# Altium footprint library PowerProducts.PCBLIB: 166 footprints (part 2 of 11)
Each footprint in its own frame and in the unit in brackets; x right, y up, seen from the top. Pads: shape width x height; smd on the part's side, far side on the other; paste and mask are expansions set on the pad; w line width, h text height; cw(c..) or ccw(c..) is an arc to the next point about the centre after c.
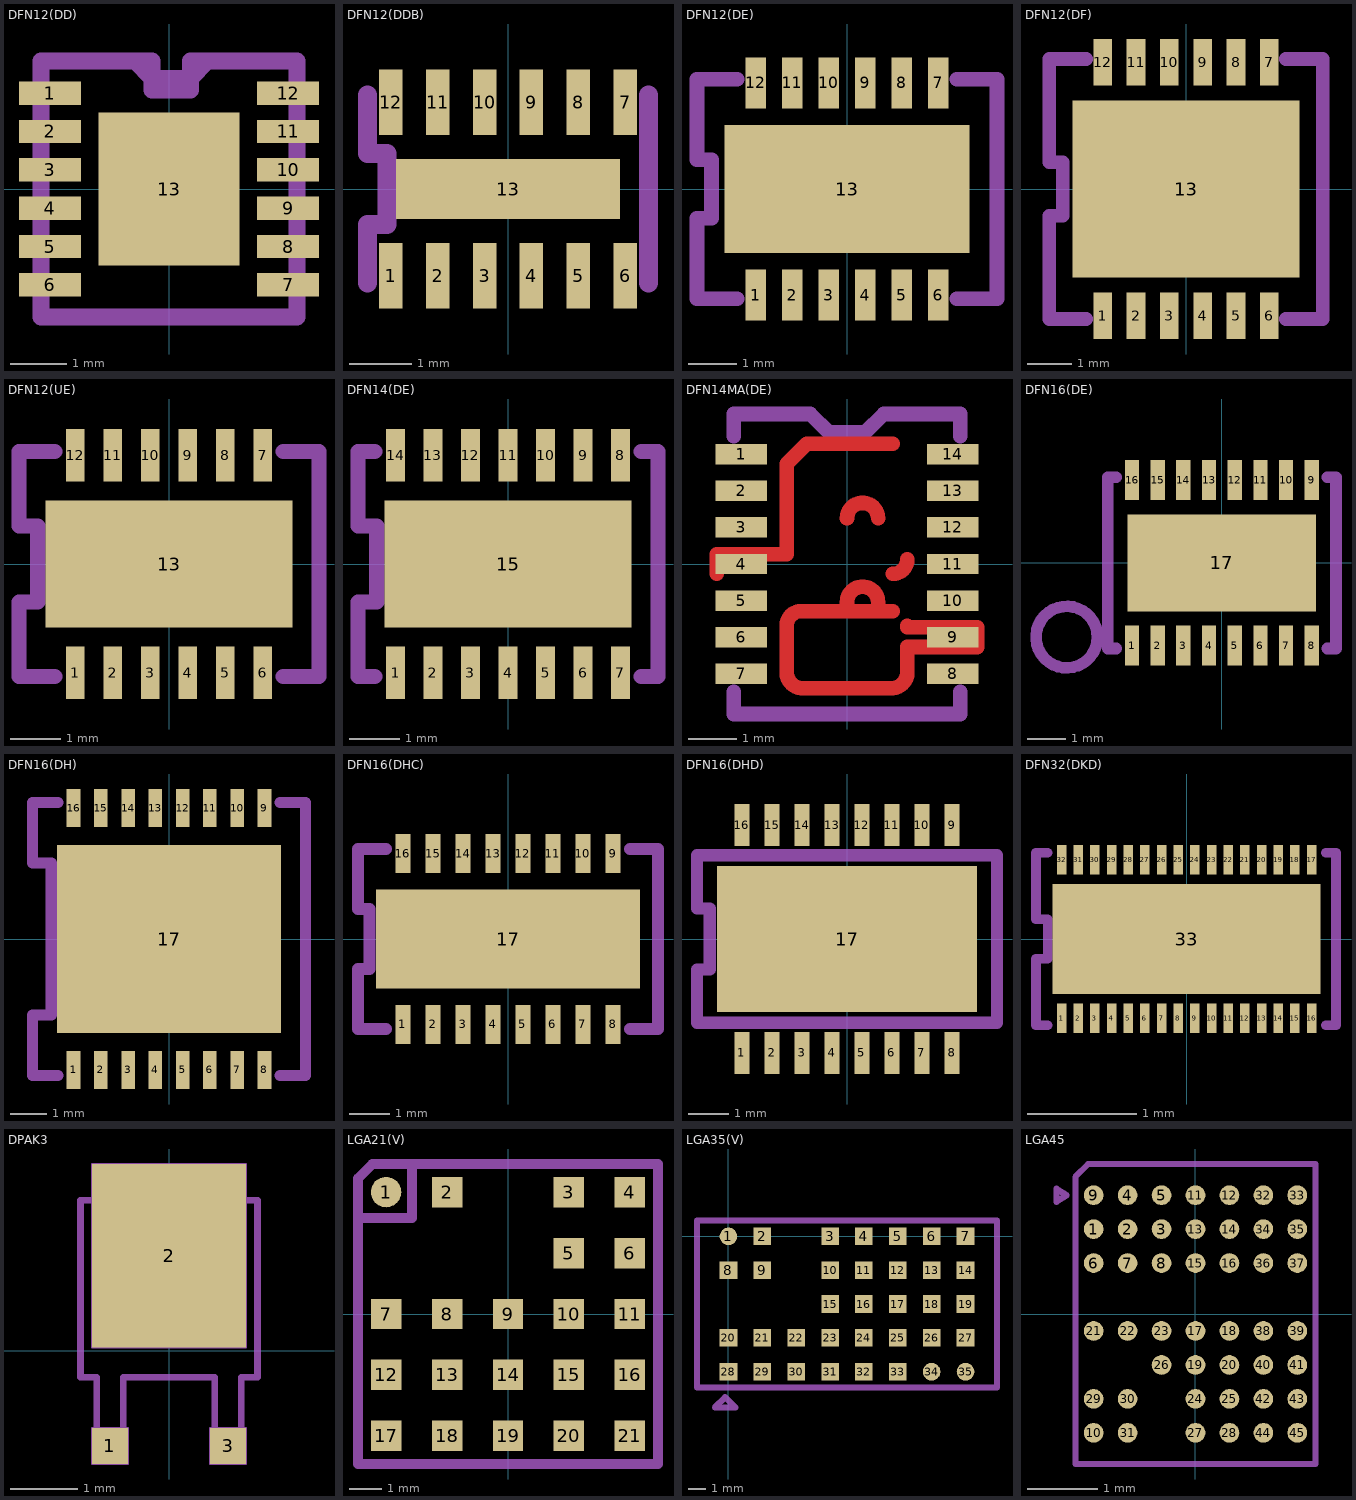
[diagram p1: the footprints below, top view; thin cyan lines are the x and y axes]

## DFN12(DD) [mil]
pads (13):
  rect 42.82x16.24 smd: 1(-82.53,66.44) 2(-82.53,39.86) 3(-82.53,13.29) 4(-82.53,-13.29) 5(-82.53,-39.86) 6(-82.53,-66.44) 7(82.53,-66.44) 8(82.53,-39.86) 9(82.53,-13.29) 10(82.53,13.29) 11(82.53,39.86) 12(82.53,66.44)
  rect 97.44x106.3 smd: 13(0,0)
Top Layer:
  region: 0,0 10,0 10,10 0,10
Top Paste:
  region: 0,0 10,0 10,10 0,10
Top Solder:
  region: 0,0 10,0 10,10 0,10
Mechanical 2:
  lines w11.81: -23.62,88.58 -11.81,88.58 -11.81,76.64 ; -23.62,88.58 -88.58,88.58 -88.58,-88.58 88.58,-88.58 88.58,-82.68 88.58,88.58 26.57,88.58 ; -23.62,88.58 -11.81,76.64 ; -11.81,76.64 -11.81,68.47 14.76,68.47 14.76,76.64 ; -11.81,76.64 14.76,76.64 ; 14.76,76.64 14.76,88.58 26.57,88.58 ; 14.76,76.64 26.57,88.58

## DFN12(DDB) [mil]
pads (13):
  rect 14.76x41.34 smd: 1(-73.82,-54.63) 2(-44.29,-54.63) 3(-14.76,-54.63) 4(14.76,-54.63) 5(44.29,-54.63) 6(73.82,-54.63) 7(73.82,54.63) 8(44.29,54.63) 9(14.76,54.63) 10(-14.76,54.63) 11(-44.29,54.63) 12(-73.82,54.63)
  rect 141.14x37.8 smd: 13(0,0)
Mechanical 2:
  lines w12: -88.58,-59.06 -88.58,-22.5 -76.18,-22.5 -76.18,22.5 -88.58,22.5 -88.58,59.06 ; 88.58,-59.06 88.58,59.06

## DFN12(DE) [mm]
pads (13):
  rect 0.42x1.05 smd: 1(-1.875,-2.175) 2(-1.125,-2.175) 3(-0.375,-2.175) 4(0.375,-2.175) 5(1.125,-2.175) 6(1.875,-2.175) 7(1.875,2.175) 8(1.125,2.175) 9(0.375,2.175) 10(-0.375,2.175) 11(-1.125,2.175) 12(-1.875,2.175)
  rect 5.025x2.625 smd: 13(0,0)
Mechanical 2:
  lines w0.305: -2.25,-2.25 -3.075,-2.25 -3.075,-0.6 -2.775,-0.6 -2.775,0.6 -3.075,0.6 -3.075,2.25 -2.25,2.25 ; 2.25,-2.25 3.075,-2.25 3.075,2.25 2.25,2.25

## DFN12(DF) [mil]
pads (13):
  rect 16.54x41.34 smd: 1(-73.82,-112.2) 2(-44.29,-112.2) 3(-14.76,-112.2) 4(14.76,-112.2) 5(44.29,-112.2) 6(73.82,-112.2) 7(73.82,112.2) 8(44.29,112.2) 9(14.76,112.2) 10(-14.76,112.2) 11(-44.29,112.2) 12(-73.82,112.2)
  rect 200.79x156.5 smd: 13(0,0)
Mechanical 2:
  lines w12: -88.58,-115.16 -121.06,-115.16 -121.06,-23.62 -109.25,-23.62 -109.25,23.62 -121.06,23.62 -121.06,115.16 -88.58,115.16 ; 88.58,-115.16 121.06,-115.16 121.06,115.16 88.58,115.16

## DFN12(UE) [mm]
pads (13):
  rect 0.375x1.05 smd: 1(-1.875,-2.175) 2(-1.125,-2.175) 3(-0.375,-2.175) 4(0.375,-2.175) 5(1.125,-2.175) 6(1.875,-2.175) 7(1.875,2.175) 8(1.125,2.175) 9(0.375,2.175) 10(-0.375,2.175) 11(-1.125,2.175) 12(-1.875,2.175)
  rect 4.95x2.55 smd: 13(0,0)
Mechanical 2:
  lines w0.305: -2.286,-2.25 -3,-2.25 -3,-0.762 -2.625,-0.762 -2.625,0.762 -3,0.762 -3,2.25 -2.286,2.25 ; 2.286,-2.25 3,-2.25 3,2.25 2.286,2.25

## DFN14(DE) [mm]
pads (15):
  rect 0.375x1.05 smd: 1(-2.25,-2.175) 2(-1.5,-2.175) 3(-0.75,-2.175) 4(0,-2.175) 5(0.75,-2.175) 6(1.5,-2.175) 7(2.25,-2.175) 8(2.25,2.175) 9(1.5,2.175) 10(0.75,2.175) 11(0,2.175) 12(-0.75,2.175) 13(-1.5,2.175) 14(-2.25,2.175)
  rect 4.95x2.55 smd: 15(0,0)
Mechanical 2:
  lines w0.305: -2.667,-2.25 -3,-2.25 -3,-0.762 -2.625,-0.762 -2.625,0.762 -3,0.762 -3,2.25 -2.667,2.25 ; 2.667,-2.25 3,-2.25 3,2.25 2.667,2.25

## DFN14MA(DE) [mil]
pads (14):
  rect 41.34x16.54 smd: 1(-85.33,88.58) 2(-85.33,59.06) 3(-85.33,29.53) 4(-85.33,0) 5(-85.33,-29.53) 6(-85.33,-59.06) 7(-85.33,-88.58) 8(85.33,-88.58) 9(85.33,-59.06) 10(85.33,-29.53) 11(85.33,0) 12(85.33,29.53) 13(85.33,59.06) 14(85.33,88.58)
Top Layer:
  lines w11.81: -105.12,-7.97 -105.12,7.97 -48.72,7.97 -48.72,80.91 -32.48,97.15 36.91,97.15 ; 0,-30.84 cw(c12.54,-30.84) 25.09,-30.84 ; 0,36.78 cw(c12.54,36.78) 25.09,36.78 ; 36.91,-38.09 -36.91,-38.09 ccw(c-36.91,-49.9) -48.72,-49.9 -48.72,-85.63 ccw(c-35.42,-87.09) -36.91,-100.39 36.91,-100.39 ccw(c35.42,-87.09) 48.72,-85.63 48.72,-67.03 105.12,-67.03 105.12,-51.08 48.72,-51.08 48.72,-49.9 ; 36.91,-7.97 ccw(c36.91,3.84) 48.72,3.84
Top Paste:
  lines w5.91: -105.12,-7.97 -105.12,7.97 -48.72,7.97 -48.72,80.91 -32.48,97.15 36.91,97.15 ; 0,-30.84 cw(c12.54,-30.84) 25.09,-30.84 ; 0,36.78 cw(c12.54,36.78) 25.09,36.78 ; 36.91,-38.09 -36.91,-38.09 ccw(c-36.91,-49.9) -48.72,-49.9 -48.72,-85.63 ccw(c-35.42,-87.09) -36.91,-100.39 36.91,-100.39 ccw(c35.42,-87.09) 48.72,-85.63 48.72,-67.03 105.12,-67.03 105.12,-51.08 48.72,-51.08 48.72,-49.9 ; 36.91,-7.97 ccw(c36.91,3.84) 48.72,3.84
Top Solder:
  lines w14.17: -105.12,-7.97 -105.12,7.97 -48.72,7.97 -48.72,80.91 -32.48,97.15 36.91,97.15 ; 0,-30.84 cw(c12.54,-30.84) 25.09,-30.84 ; 0,36.78 cw(c12.54,36.78) 25.09,36.78 ; 36.91,-38.09 -36.91,-38.09 ccw(c-36.91,-49.9) -48.72,-49.9 -48.72,-85.63 ccw(c-35.42,-87.09) -36.91,-100.39 36.91,-100.39 ccw(c35.42,-87.09) 48.72,-85.63 48.72,-67.03 105.12,-67.03 105.12,-51.08 48.72,-51.08 48.72,-49.9 ; 36.91,-7.97 ccw(c36.91,3.84) 48.72,3.84
Mechanical 2:
  lines w11.81: -91.54,-103.35 -91.54,-121.06 91.54,-121.06 91.54,-103.35 ; -91.54,103.35 -91.54,121.06 -29.53,121.06 -14.76,106.3 14.76,106.3 29.53,121.06 91.54,121.06 91.54,103.35

## DFN16(DE) [mm]
pads (17):
  rect 0.375x1.05 smd: 1(-2.362,-2.175) 2(-1.688,-2.175) 3(-1.012,-2.175) 4(-0.338,-2.175) 5(0.338,-2.175) 6(1.012,-2.175) 7(1.688,-2.175) 8(2.362,-2.175) 9(2.362,2.175) 10(1.688,2.175) 11(1.012,2.175) 12(0.338,2.175) 13(-0.338,2.175) 14(-1.012,2.175) 15(-1.688,2.175) 16(-2.362,2.175)
  rect 4.95x2.55 smd: 17(0,0)
Mechanical 2:
  circle w0.305: c-4.079,-1.95 r0.808
  lines w0.305: -2.775,-2.25 -3,-2.25 -3,2.25 -2.775,2.25 ; 2.775,-2.25 3,-2.25 3,2.25 2.775,2.25

## DFN16(DH) [mm]
pads (17):
  rect 0.375x1.05 smd: 1(-2.625,-3.6) 2(-1.875,-3.6) 3(-1.125,-3.6) 4(-0.375,-3.6) 5(0.375,-3.6) 6(1.125,-3.6) 7(1.875,-3.6) 8(2.625,-3.6) 9(2.625,3.6) 10(1.875,3.6) 11(1.125,3.6) 12(0.375,3.6) 13(-0.375,3.6) 14(-1.125,3.6) 15(-1.875,3.6) 16(-2.625,3.6)
  rect 6.15x5.175 smd: 17(0,0)
Mechanical 2:
  lines w0.305: -3.048,-3.75 -3.75,-3.75 -3.75,-2.095 -3.238,-2.095 -3.238,2.095 -3.75,2.095 -3.75,3.75 -3.048,3.75 ; 3.048,-3.75 3.75,-3.75 3.75,3.75 3.048,3.75

## DFN16(DHC) [mil]
pads (17):
  rect 14.76x38.39 smd: 1(-103.35,-84.15) 2(-73.82,-84.15) 3(-44.29,-84.15) 4(-14.76,-84.15) 5(14.76,-84.15) 6(44.29,-84.15) 7(73.82,-84.15) 8(103.35,-84.15) 9(103.35,84.15) 10(73.82,84.15) 11(44.29,84.15) 12(14.76,84.15) 13(-14.76,84.15) 14(-44.29,84.15) 15(-73.82,84.15) 16(-103.35,84.15)
  rect 259.84x97.44 smd: 17(0,0)
Mechanical 2:
  lines w12: -120,-88.58 -147.64,-88.58 -147.64,-29.53 -136.42,-29.53 -136.42,29.53 -147.64,29.53 -147.64,88.58 -120,88.58 ; 120,-88.58 147.64,-88.58 147.64,88.58 120,88.58

## DFN16(DHD) [mil]
pads (17):
  rect 14.76x41.34 smd: 1(-103.35,-112.2) 2(-73.82,-112.2) 3(-44.29,-112.2) 4(-14.76,-112.2) 5(14.76,-112.2) 6(44.29,-112.2) 7(73.82,-112.2) 8(103.35,-112.2) 9(103.35,112.2) 10(73.82,112.2) 11(44.29,112.2) 12(14.76,112.2) 13(-14.76,112.2) 14(-44.29,112.2) 15(-73.82,112.2) 16(-103.35,112.2)
  rect 256.3x144.09 smd: 17(0,0)
Mechanical 2:
  lines w12: -147.64,-82.5 147.64,-82.5 147.64,82.5 -147.64,82.5 -147.64,30 -135,30 -135,-30 -147.64,-30 -147.64,-82.5

## DFN32(DKD) [mil]
pads (33):
  rect 3.43x10.5 smd: 1(-44.98,-28.5) 2(-38.98,-28.5) 3(-32.98,-28.5) 4(-26.99,-28.5) 5(-20.99,-28.5) 6(-14.99,-28.5) 7(-9,-28.5) 8(-3,-28.5) 9(3,-28.5) 10(9,-28.5) 11(14.99,-28.5) 12(20.99,-28.5) 13(26.99,-28.5) 14(32.98,-28.5) 15(38.98,-28.5) 16(44.98,-28.5) 17(44.98,28.5) 18(38.98,28.5) 19(32.98,28.5) 20(26.99,28.5) 21(20.99,28.5) 22(14.99,28.5) 23(9,28.5) 24(3,28.5) 25(-3,28.5) 26(-9,28.5) 27(-14.99,28.5) 28(-20.99,28.5) 29(-26.99,28.5) 30(-32.98,28.5) 31(-38.98,28.5) 32(-44.98,28.5)
  rect 96.39x39.62 smd: 33(0,0)
Mechanical 2:
  lines w3.43: -50.01,-30.96 -54.17,-30.96 -54.17,-7.14 -50.01,-7.14 -50.01,7.14 -54.17,7.14 -54.17,30.96 -50.01,30.96 ; 50.01,-30.96 53.76,-30.96 53.76,30.96 50.01,30.96

## DPAK3 [mil]
pads (3):
  rect 20.96x20.96 smd: 1(-34.29,-55.25) 3(34.29,-55.25)
  rect 89.53x106.68 smd: 2(0,55.25)
Mechanical 2:
  lines w1.14: -44.77,-65.72 -23.81,-65.72 ; -44.77,-65.72 -44.77,-44.77 ; -44.77,-65.72 -23.81,-65.72 ; -44.77,-65.72 -44.77,-44.77 ; -44.77,-44.77 -23.81,-44.77 ; -44.77,-44.77 -23.81,-44.77 ; -44.77,1.91 -44.77,108.59 ; -44.77,1.91 44.77,1.91 ; -44.77,1.91 -44.77,108.59 ; -44.77,1.91 44.77,1.91 ; -44.77,108.59 44.77,108.59 ; -44.77,108.59 44.77,108.59 ; -23.81,-65.72 -23.81,-44.77 ; -23.81,-65.72 -23.81,-44.77 ; 23.81,-65.72 23.81,-44.77 ; 23.81,-65.72 44.77,-65.72 ; 23.81,-65.72 23.81,-44.77 ; 23.81,-65.72 44.77,-65.72 ; 23.81,-44.77 44.77,-44.77 ; 23.81,-44.77 44.77,-44.77 ; 44.77,-65.72 44.77,-44.77 ; 44.77,-65.72 44.77,-44.77 ; 44.77,1.91 44.77,108.59 ; 44.77,1.91 44.77,108.59
  lines w3.81: -45.72,87.63 -51.44,87.63 -51.44,-15.24 -41.91,-15.24 -41.91,-43.82 ; -26.67,-43.82 -26.67,-15.24 26.67,-15.24 26.67,-43.82 ; 41.91,-43.82 41.91,-15.24 51.44,-15.24 51.44,87.63 45.72,87.63

## LGA21(V) [mil]
pads (21):
  rrect100% 37.5x37.5 smd: 1(-150,150)
  rect 37.5x37.5 smd: 2(-75,150) 3(75,150) 4(150,150) 5(75,75) 6(150,75) 7(-150,0) 8(-75,0) 9(0,0) 10(75,0) 11(150,0) 12(-150,-75) 13(-75,-75) 14(0,-75) 15(75,-75) 16(150,-75) 17(-150,-150) 18(-75,-150) 19(0,-150) 20(75,-150) 21(150,-150)
Mechanical 2:
  lines w11.81: -183.07,118.11 -118.11,118.11 -118.11,183.07 ; -184.55,-184.55 -184.55,166.83 -166.83,184.55 184.55,184.55 184.55,-184.55 -184.55,-184.55

## LGA35(V) [mil]
pads (35):
  rrect100% 38.98x38.98 smd: 1(0,0) 34(450,-300) 35(525,-300)
  rect 38.98x38.98 smd: 2(75,0) 3(225,0) 4(300,0) 5(375,0) 6(450,0) 7(525,0) 8(0,-75) 9(75,-75) 10(225,-75) 11(300,-75) 12(375,-75) 13(450,-75) 14(525,-75) 15(225,-150) 16(300,-150) 17(375,-150) 18(450,-150) 19(525,-150) 20(0,-225) 21(75,-225) 22(150,-225) 23(225,-225) 24(300,-225) 25(375,-225) 26(450,-225) 27(525,-225) 28(0,-300) 29(75,-300) 30(150,-300) 31(225,-300) 32(300,-300) 33(375,-300)
Mechanical 2:
  lines w13.5: -69.69,-334.55 594.69,-334.55 594.69,34.55 -69.69,34.55 -69.69,-334.55 ; -30,-378.75 -7.5,-356.25 15,-378.75 -30,-378.75

## LGA45 [mil]
pads (45):
  rrect100% 11.05x11.05 smd: 1(-57.15,47.63) 2(-38.1,47.63) 3(-19.05,47.63) 4(-38.1,66.68) 5(-19.05,66.68) 6(-57.15,28.58) 7(-38.1,28.58) 8(-19.05,28.58) 9(-57.15,66.68) 10(-57.15,-66.68) 11(0,66.68) 12(19.05,66.68) 13(0,47.63) 14(19.05,47.63) 15(0,28.58) 16(19.05,28.58) 17(0,-9.53) 18(19.05,-9.53) 19(0,-28.58) 20(19.05,-28.58) 21(-57.15,-9.53) 22(-38.1,-9.53) 23(-19.05,-9.53) 24(0,-47.63) 25(19.05,-47.63) 26(-19.05,-28.58) 27(0,-66.68) 28(19.05,-66.68) 29(-57.15,-47.63) 30(-38.1,-47.63) 31(-38.1,-66.68) 32(38.1,66.68) 33(57.15,66.68) 34(38.1,47.63) 35(57.15,47.63) 36(38.1,28.58) 37(57.15,28.58) 38(38.1,-9.53) 39(57.15,-9.53) 40(38.1,-28.58) 41(57.15,-28.58) 42(38.1,-47.63) 43(57.15,-47.63) 44(38.1,-66.68) 45(57.15,-66.68)
Mechanical 2:
  lines w3.43: -78.1,62.87 -72.39,66.68 -78.1,70.49 -78.1,62.87 ; -67.44,-84.2 67.44,-84.2 67.44,84.2 -60.2,84.2 -67.44,76.96 -67.44,-84.2